# Altium footprint library cool_library.PcbLib: 1182 footprints (part 2 of 75)
Each footprint in its own frame and in the unit in brackets; x right, y up, seen from the top. Pads: shape width x height; smd on the part's side, far side on the other; paste and mask are expansions set on the pad; w line width, h text height; cw(c..) or ccw(c..) is an arc to the next point about the centre after c.
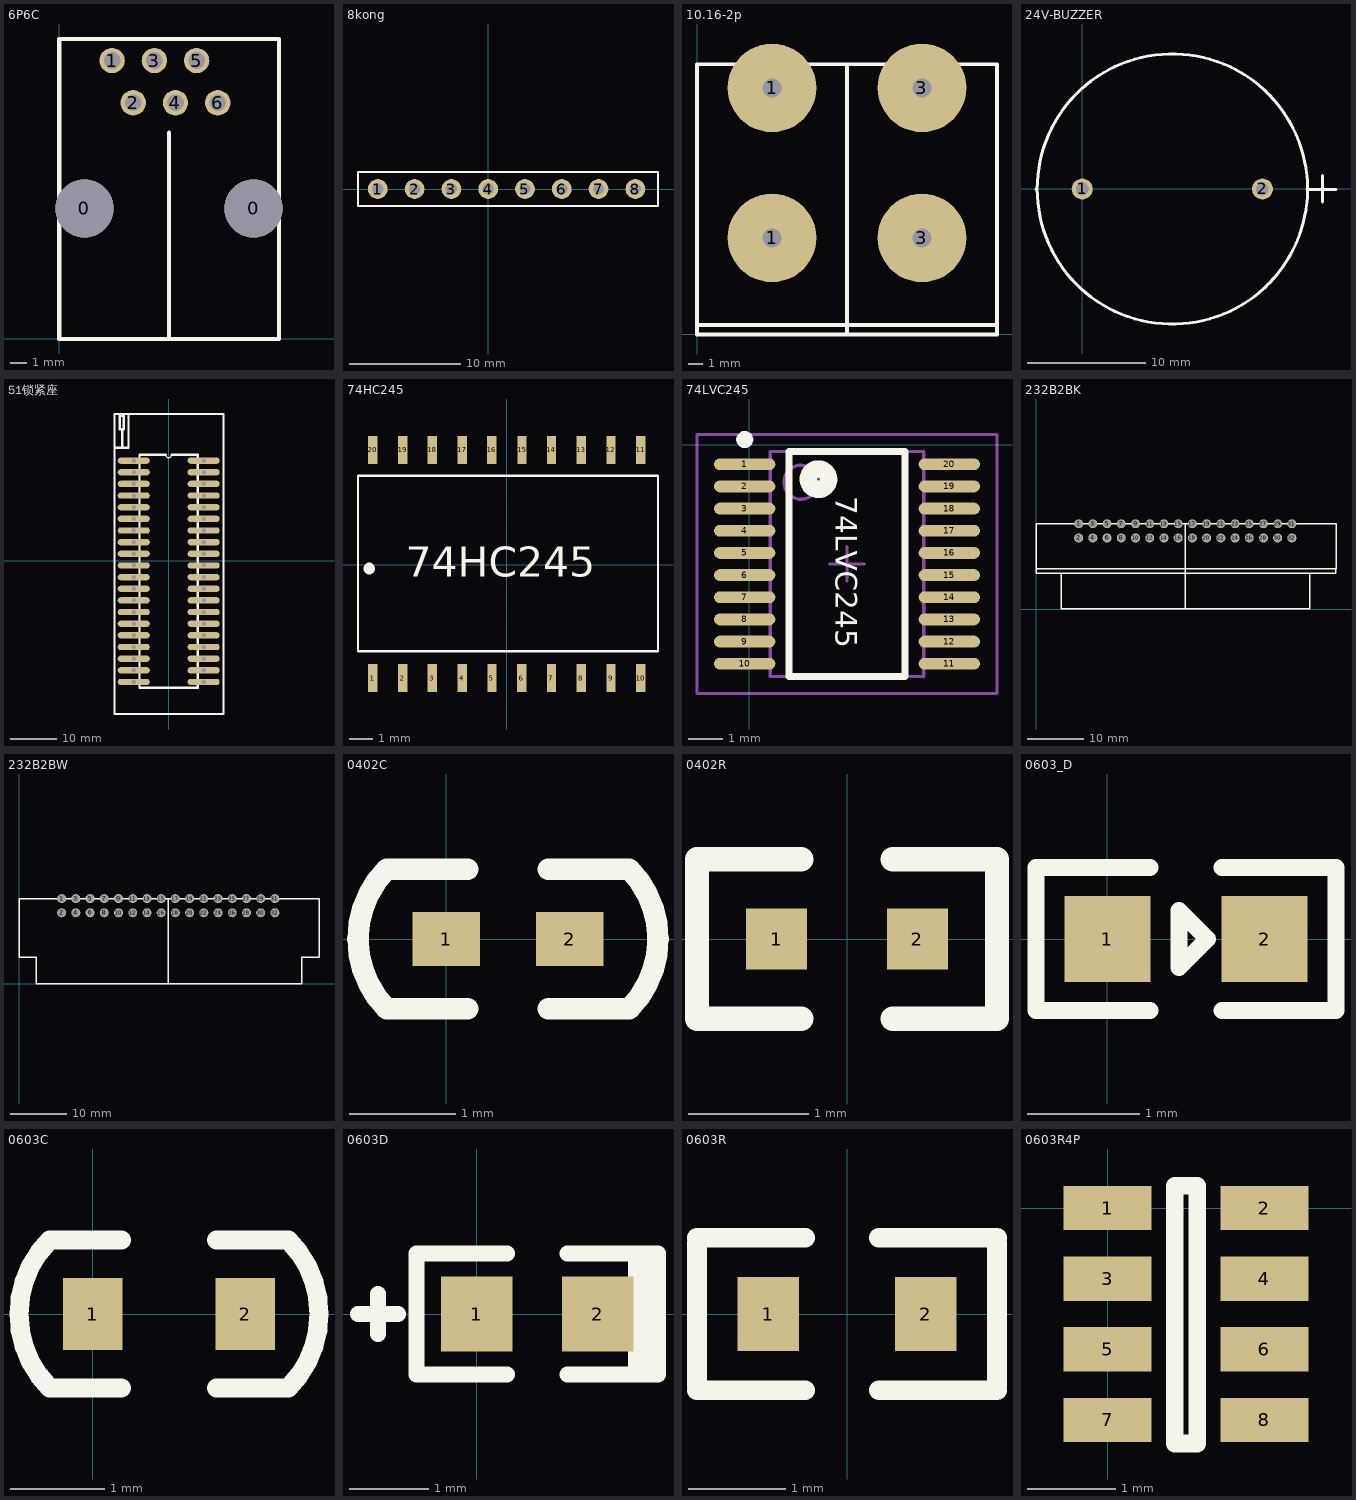
[diagram p1: the footprints below, top view; thin cyan lines are the x and y axes]

## 6P6C [mm]
pads (8):
  round 3.5 hole 3.5: 0(1.52,7.85) 0(11.68,7.85)
  round 1.524 hole 1: 1(3.18,16.74) 2(4.45,14.2) 3(5.72,16.74) 4(6.99,14.2) 5(8.26,16.74) 6(9.53,14.2)
Top Overlay:
  lines w0.254: 0,18 0,0 13.2,0 ; 0,18.034 13.2,18.034 ; 6.6,0 6.6,12.4 ; 13.208,0 13.208,18

## 8kong [mil]
pads (8):
  round 70 hole 40: 1(-390,0) 2(-260,0) 3(-130,0) 4(0,0) 5(130,0) 6(260,0) 7(390,0) 8(520,0)
Top Overlay:
  lines w8: -460,-60 -460,60 600,60 600,-60 580,-60 -460,-60

## 10.16-2p [mm]
pads (4):
  round 6 hole 1.3: 1(5.08,6.54) 1(5.08,16.7) 3(15.24,6.54) 3(15.24,16.7)
Top Overlay:
  lines w0.254: 0,0.635 20.32,0.635 ; 10.16,0 10.16,18.161 ; 0,0 0,18.3 20.32,18.3 20.32,0 0,0

## 24V-BUZZER [mil]
pads (2):
  round 70 hole 42: 1(0,0) 2(600,0)
Top Overlay:
  circle w10: c300,0 r450
  lines w10: -154,-1 -151,2 ; 749,0 750,-1 845,-1 ; 800,-43 800,45

## 51锁紧座 [mm] "MCU_P40"
pads (40):
  oval 7x1.38 hole 1: 1(-7.609,21.848) 2(-7.609,19.308) 3(-7.609,16.768) 4(-7.609,14.228) 5(-7.609,11.688) 6(-7.609,9.148) 7(-7.609,6.608) 8(-7.609,4.068) 9(-7.609,1.528) 10(-7.609,-1.012) 11(-7.609,-3.552) 12(-7.609,-6.092) 13(-7.609,-8.632) 14(-7.609,-11.172) 15(-7.609,-13.712) 16(-7.609,-16.252) 17(-7.609,-18.792) 18(-7.609,-21.332) 19(-7.609,-23.872) 20(-7.609,-26.412) 21(7.631,-26.412) 22(7.631,-23.872) 23(7.631,-21.332) 24(7.631,-18.792) 25(7.631,-16.252) 26(7.631,-13.712) 27(7.631,-11.172) 28(7.631,-8.632) 29(7.631,-6.092) 30(7.631,-3.552) 31(7.631,-1.012) 32(7.631,1.528) 33(7.631,4.068) 34(7.631,6.608) 35(7.631,9.148) 36(7.631,11.688) 37(7.631,14.228) 38(7.631,16.768) 39(7.631,19.308) 40(7.631,21.848)
Top Overlay:
  lines w0.254: -0.624,23.118 ccw(c0.011,23.118) 0.646,23.118
  lines w0.5: -11.8,21.848 -11.8,32.008 11.949,32.008 11.949,21.848 11.949,-33.397 -9.006,-33.397 ; -11.8,22.61 -11.8,-33.397 -8.879,-33.397 ; -11.673,24.642 -8.752,24.642 -8.752,26.801 -8.752,32.008 ; -10.149,24.642 -10.149,28.706 ; -9.768,28.833 -9.768,28.706 ; -0.624,23.118 -6.339,23.118 -6.339,-27.682 6.361,-27.682 6.361,23.118 0.646,23.118 ; -9.768,28.706 -9.768,31.627 -10.657,31.627 -10.657,28.706 -9.768,28.706

## 74HC245 [mm]
pads (20):
  rect 0.4x1.2 smd: 1(-5.715,-4.826) 2(-4.445,-4.826) 3(-3.175,-4.826) 4(-1.905,-4.826) 5(-0.635,-4.826) 6(0.635,-4.826) 7(1.905,-4.826) 8(3.175,-4.826) 9(4.445,-4.826) 10(5.715,-4.826) 11(5.713,4.91) 12(4.443,4.91) 13(3.173,4.91) 14(1.903,4.91) 15(0.648,4.91) 16(-0.637,4.91) 17(-1.907,4.91) 18(-3.177,4.91) 19(-4.447,4.91) 20(-5.717,4.91)
Top Overlay:
  lines w0.1: -6.35,-3.683 -6.35,3.81 6.45,3.81 6.45,-3.683 -6.35,-3.683
  lines w0.5: -5.868,-0.164 ccw(c-6.004,-0.152) -5.867,-0.152
  text "74HC245" at -4.318,-0.508 h1.27
3D body: height 2.8, standoff 0, extent -6.5,-5.142 6.5,5.193

## 74LVC245 [mm]
pads (20):
  oval 1.8x0.35 smd: 1(-0.13,-0.58) 2(-0.13,-1.23) 3(-0.13,-1.88) 4(-0.13,-2.53) 5(-0.13,-3.18) 6(-0.13,-3.83) 7(-0.13,-4.48) 8(-0.13,-5.13) 9(-0.13,-5.78) 10(-0.13,-6.43) 11(5.87,-6.43) 12(5.87,-5.78) 13(5.87,-5.13) 14(5.87,-4.48) 15(5.87,-3.83) 16(5.87,-3.18) 17(5.87,-2.53) 18(5.87,-1.88) 19(5.87,-1.23) 20(5.87,-0.58)
Top Overlay:
  circle w0.508: c2.032,-1.016 r0.3
  circle w0.25: c-0.13,0.145 r0.125
  lines w0.2: 1.17,-6.805 4.57,-6.805 4.57,-0.205 1.17,-0.205 1.17,-6.805
  text "74LVC245" at 2.54,-1.524 h0.64
Mechanical 13:
  circle w0.1: c1.52,-1.105 r0.5
  lines w0.1: 0.62,-6.805 5.12,-6.805 5.12,-0.205 0.62,-0.205 0.62,-6.805
Mechanical 15:
  lines w0.1: 2.37,-3.505 3.37,-3.505 ; 2.87,-4.005 2.87,-3.005 ; -1.53,-7.305 7.27,-7.305 7.27,0.295 -1.53,0.295 -1.53,-7.305
3D body: height 1.1, standoff -0.09, extent -0.251,-6.859 6.029,-0.359

## 232B2BK [mm]
pads (32):
  round 1.6 hole 1.3: 1(7.62,15.24) 2(7.62,12.7) 3(10.16,15.24) 4(10.16,12.7) 5(12.7,15.24) 6(12.7,12.7) 7(15.24,15.24) 8(15.24,12.7) 9(17.78,15.24) 10(17.78,12.7) 11(20.32,15.24) 12(20.32,12.7) 13(22.86,15.24) 14(22.86,12.7) 15(25.4,15.24) 16(25.4,12.7) 17(27.94,15.24) 18(27.94,12.7) 19(30.48,15.24) 20(30.48,12.7) 21(33.02,15.24) 22(33.02,12.7) 23(35.56,15.24) 24(35.56,12.7) 25(38.1,15.24) 26(38.1,12.7) 27(40.64,15.24) 28(40.64,12.7) 29(43.18,15.24) 30(43.18,12.7) 31(45.72,15.24) 32(45.72,12.7)
Top Overlay:
  lines w0.254: 0.026,6.41 53.594,6.41 53.594,7.154 ; 0.026,6.436 0.026,7.16 ; 4.47,6.36 4.47,0.06 48.87,0.06 48.87,6.36 ; 26.67,0.06 26.67,15.24 ; 53.594,7.16 0.026,7.16 ; 53.594,15.24 53.6,15.234 53.6,14.478 ; 53.6,7.16 53.6,14.98 ; 53.6,15.24 0,15.24 0.026,15.214 0.026,7.16

## 232B2BW [mm]
pads (32):
  round 1.6 hole 1.3: 1(7.62,15.24) 2(7.62,12.7) 3(10.16,15.24) 4(10.16,12.7) 5(12.7,15.24) 6(12.7,12.7) 7(15.24,15.24) 8(15.24,12.7) 9(17.78,15.24) 10(17.78,12.7) 11(20.32,15.24) 12(20.32,12.7) 13(22.86,15.24) 14(22.86,12.7) 15(25.4,15.24) 16(25.4,12.7) 17(27.94,15.24) 18(27.94,12.7) 19(30.48,15.24) 20(30.48,12.7) 21(33.02,15.24) 22(33.02,12.7) 23(35.56,15.24) 24(35.56,12.7) 25(38.1,15.24) 26(38.1,12.7) 27(40.64,15.24) 28(40.64,12.7) 29(43.18,15.24) 30(43.18,12.7) 31(45.72,15.24) 32(45.72,12.7)
Top Overlay:
  lines w0.254: 26.67,0.054 26.67,15.24 ; 53.594,15.24 53.6,15.234 53.6,14.478 ; 53.6,14.98 53.6,4.8 50.5,4.8 50.5,0 3.1,0 3.1,4.8 0.026,4.8 0.026,15.214 0,15.24 53.6,15.24

## 0402C [mil]
pads (2):
  rect 25x20 smd: 1(0,0) 2(46,0)
Top Overlay:
  lines w8: 8,-26 -22,-26 cw(c4,0) -22,26 8,26 ; 38,-26 68,-26 ccw(c42,0) 68,26 38,26

## 0402R [mil]
pads (2):
  rect 20x20 smd: 1(-23,0) 2(23,0)
Top Overlay:
  lines w8: -15,-26 -49,-26 -49,26 -15,26 ; 15,-26 49,-26 49,26 15,26

## 0603_D [mil]
pads (2):
  rect 30x30 smd: 1(0,0) 2(55,0)
Top Overlay:
  lines w4.33: 24.76,-10.24 25,-10
  lines w5.91: 15,-25 -25,-25 -25,25 15,25 ; 40,-25 80,-25 80,25 40,25 ; 25,-10 35,0 25,10 25,-10

## 0603C [mil]
pads (2):
  rect 25x30 smd: 1(0,0) 2(64,0)
Top Overlay:
  lines w8: 12,-31 -18,-31 cw(c13,0) -18,31 12,31 ; 52,-31 82,-31 ccw(c51,0) 82,31 52,31

## 0603D [mm]
height 8.23
pads (2):
  rect 0.9x0.95 smd: 1(0,0) 2(1.524,0)
Top Overlay:
  rectangle: 1.905,-0.762 2.286,0.762
  lines w0.2: -1.499,0 -0.991,0 ; -1.245,-0.254 -1.245,0.254 ; 0.381,-0.762 -0.762,-0.762 -0.762,0.762 0.381,0.762 ; 1.143,-0.762 2.286,-0.762 2.286,0.762 1.143,0.762

## 0603R [mil]
pads (2):
  rect 25x30 smd: 1(-32,0) 2(32,0)
Top Overlay:
  lines w8: -61,-31 -17,-31 ; -61,-29 -61,29 ; -61,31 -17,31 ; 13,-31 61,-31 ; 13,31 61,31 ; 61,-29 61,29

## 0603R4P [mm]
pads (8):
  rect 1x0.5 smd: 1(0,0) 2(1.778,0) 3(0,-0.8) 4(1.778,-0.8) 5(0,-1.6) 6(1.778,-1.6) 7(0,-2.4) 8(1.778,-2.4)
Top Overlay:
  lines w0.2: 0.762,-2.667 0.762,0.254 1.016,0.254 1.016,-2.667 0.762,-2.667